# Altium footprint library 按键.PcbLib: 105 footprints (part 3 of 7)
Each footprint in its own frame and in the unit in brackets; x right, y up, seen from the top. Pads: shape width x height; smd on the part's side, far side on the other; paste and mask are expansions set on the pad; w line width, h text height; cw(c..) or ccw(c..) is an arc to the next point about the centre after c.
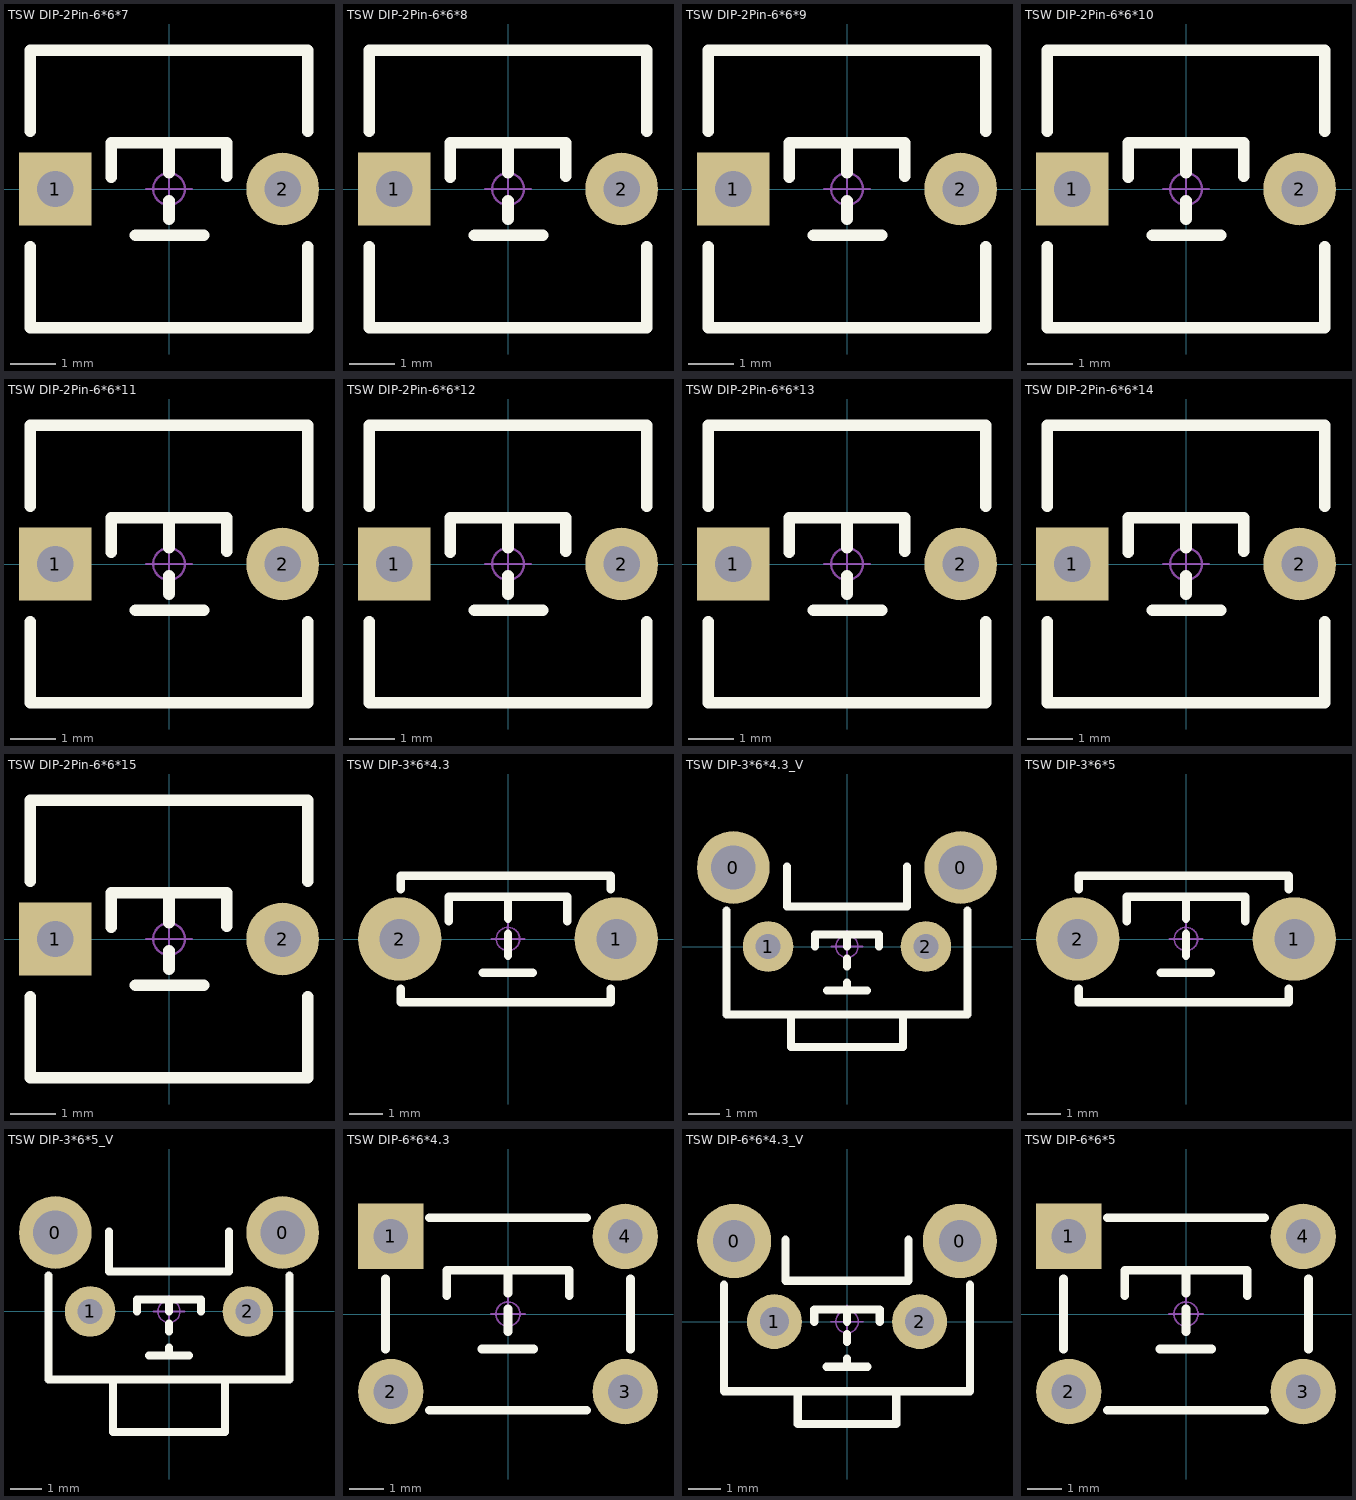
[diagram p2: the footprints below, top view; thin cyan lines are the x and y axes]

## TSW DIP-2Pin-6*6*7 [mm] "2Pin，6*6*7mm"
pads (2):
  rect 1.6x1.6 hole 0.8: 1(-2.5,0)
  round 1.6 hole 0.8: 2(2.5,0)
Top Overlay:
  lines w0.254: -3.048,-1.27 -3.048,-3.048 3.048,-3.048 3.048,-1.27 ; -3.048,1.27 -3.048,3.048 3.048,3.048 3.048,1.27 ; -1.27,0.254 -1.27,1.016 1.27,1.016 1.27,0.279 ; -0.737,-1.016 0.762,-1.016 ; 0,-0.66 0,-0.254 ; 0,0.356 0,1.016
Mechanical 15:
  circle w0.05: c0,0 r0.35
  lines w0.05: -0.5,0 0.5,0 ; 0,-0.5 0,0.5
3D body "TSW DIP-2Pin-6x6x7.STEP": height 7.05, standoff -3.45, extent -3,-3 3,3

## TSW DIP-2Pin-6*6*8 [mm] "2Pin，6*6*8mm"
pads (2):
  rect 1.6x1.6 hole 0.8: 1(-2.5,0)
  round 1.6 hole 0.8: 2(2.5,0)
Top Overlay:
  lines w0.254: -3.048,-1.27 -3.048,-3.048 3.048,-3.048 3.048,-1.27 ; -3.048,1.27 -3.048,3.048 3.048,3.048 3.048,1.27 ; -1.27,0.254 -1.27,1.016 1.27,1.016 1.27,0.279 ; -0.737,-1.016 0.762,-1.016 ; 0,-0.66 0,-0.254 ; 0,0.356 0,1.016
Mechanical 15:
  circle w0.05: c0,0 r0.35
  lines w0.05: -0.5,0 0.5,0 ; 0,-0.5 0,0.5
3D body "TSW DIP-2Pin-6x6x8.STEP": height 8.05, standoff -3.45, extent -3,-3 3,3

## TSW DIP-2Pin-6*6*9 [mm] "2Pin，6*6*9mm"
pads (2):
  rect 1.6x1.6 hole 0.8: 1(-2.5,0)
  round 1.6 hole 0.8: 2(2.5,0)
Top Overlay:
  lines w0.254: -3.048,-1.27 -3.048,-3.048 3.048,-3.048 3.048,-1.27 ; -3.048,1.27 -3.048,3.048 3.048,3.048 3.048,1.27 ; -1.27,0.254 -1.27,1.016 1.27,1.016 1.27,0.279 ; -0.737,-1.016 0.762,-1.016 ; 0,-0.66 0,-0.254 ; 0,0.356 0,1.016
Mechanical 15:
  circle w0.05: c0,0 r0.35
  lines w0.05: -0.5,0 0.5,0 ; 0,-0.5 0,0.5
3D body "TSW DIP-2Pin-6x6x9.STEP": height 9.05, standoff -3.45, extent -3,-3 3,3

## TSW DIP-2Pin-6*6*10 [mm] "2Pin，6*6*10mm"
pads (2):
  rect 1.6x1.6 hole 0.8: 1(-2.5,0)
  round 1.6 hole 0.8: 2(2.5,0)
Top Overlay:
  lines w0.254: -3.048,-1.27 -3.048,-3.048 3.048,-3.048 3.048,-1.27 ; -3.048,1.27 -3.048,3.048 3.048,3.048 3.048,1.27 ; -1.27,0.254 -1.27,1.016 1.27,1.016 1.27,0.279 ; -0.737,-1.016 0.762,-1.016 ; 0,-0.66 0,-0.254 ; 0,0.356 0,1.016
Mechanical 15:
  circle w0.05: c0,0 r0.35
  lines w0.05: -0.5,0 0.5,0 ; 0,-0.5 0,0.5
3D body "TSW DIP-2Pin-6x6x10.STEP": height 10.05, standoff -3.45, extent -3,-3 3,3

## TSW DIP-2Pin-6*6*11 [mm] "2Pin，6*6*11mm"
pads (2):
  rect 1.6x1.6 hole 0.8: 1(-2.5,0)
  round 1.6 hole 0.8: 2(2.5,0)
Top Overlay:
  lines w0.254: -3.048,-1.27 -3.048,-3.048 3.048,-3.048 3.048,-1.27 ; -3.048,1.27 -3.048,3.048 3.048,3.048 3.048,1.27 ; -1.27,0.254 -1.27,1.016 1.27,1.016 1.27,0.279 ; -0.737,-1.016 0.762,-1.016 ; 0,-0.66 0,-0.254 ; 0,0.356 0,1.016
Mechanical 15:
  circle w0.05: c0,0 r0.35
  lines w0.05: -0.5,0 0.5,0 ; 0,-0.5 0,0.5
3D body "TSW DIP-2Pin-6x6x11.STEP": height 11.05, standoff -3.45, extent -3,-3 3,3

## TSW DIP-2Pin-6*6*12 [mm] "2Pin，6*6*12mm"
pads (2):
  rect 1.6x1.6 hole 0.8: 1(-2.5,0)
  round 1.6 hole 0.8: 2(2.5,0)
Top Overlay:
  lines w0.254: -3.048,-1.27 -3.048,-3.048 3.048,-3.048 3.048,-1.27 ; -3.048,1.27 -3.048,3.048 3.048,3.048 3.048,1.27 ; -1.27,0.254 -1.27,1.016 1.27,1.016 1.27,0.279 ; -0.737,-1.016 0.762,-1.016 ; 0,-0.66 0,-0.254 ; 0,0.356 0,1.016
Mechanical 15:
  circle w0.05: c0,0 r0.35
  lines w0.05: -0.5,0 0.5,0 ; 0,-0.5 0,0.5
3D body "TSW DIP-2Pin-6x6x12.STEP": height 12.05, standoff -3.45, extent -3,-3 3,3

## TSW DIP-2Pin-6*6*13 [mm] "2Pin，6*6*13mm"
pads (2):
  rect 1.6x1.6 hole 0.8: 1(-2.5,0)
  round 1.6 hole 0.8: 2(2.5,0)
Top Overlay:
  lines w0.254: -3.048,-1.27 -3.048,-3.048 3.048,-3.048 3.048,-1.27 ; -3.048,1.27 -3.048,3.048 3.048,3.048 3.048,1.27 ; -1.27,0.254 -1.27,1.016 1.27,1.016 1.27,0.279 ; -0.737,-1.016 0.762,-1.016 ; 0,-0.66 0,-0.254 ; 0,0.356 0,1.016
Mechanical 15:
  circle w0.05: c0,0 r0.35
  lines w0.05: -0.5,0 0.5,0 ; 0,-0.5 0,0.5
3D body "TSW DIP-2Pin-6x6x13.STEP": height 13.05, standoff -3.45, extent -3,-3 3,3

## TSW DIP-2Pin-6*6*14 [mm] "2Pin，6*6*14mm"
pads (2):
  rect 1.6x1.6 hole 0.8: 1(-2.5,0)
  round 1.6 hole 0.8: 2(2.5,0)
Top Overlay:
  lines w0.254: -3.048,-1.27 -3.048,-3.048 3.048,-3.048 3.048,-1.27 ; -3.048,1.27 -3.048,3.048 3.048,3.048 3.048,1.27 ; -1.27,0.254 -1.27,1.016 1.27,1.016 1.27,0.279 ; -0.737,-1.016 0.762,-1.016 ; 0,-0.66 0,-0.254 ; 0,0.356 0,1.016
Mechanical 15:
  circle w0.05: c0,0 r0.35
  lines w0.05: -0.5,0 0.5,0 ; 0,-0.5 0,0.5
3D body "TSW DIP-2Pin-6x6x14.STEP": height 14.05, standoff -3.45, extent -3,-3 3,3

## TSW DIP-2Pin-6*6*15 [mm] "2Pin，6*6*15mm"
pads (2):
  rect 1.6x1.6 hole 0.8: 1(-2.5,0)
  round 1.6 hole 0.8: 2(2.5,0)
Top Overlay:
  lines w0.254: -3.048,-1.27 -3.048,-3.048 3.048,-3.048 3.048,-1.27 ; -3.048,1.27 -3.048,3.048 3.048,3.048 3.048,1.27 ; -1.27,0.254 -1.27,1.016 1.27,1.016 1.27,0.279 ; -0.737,-1.016 0.762,-1.016 ; 0,-0.66 0,-0.254 ; 0,0.356 0,1.016
Mechanical 15:
  circle w0.05: c0,0 r0.35
  lines w0.05: -0.5,0 0.5,0 ; 0,-0.5 0,0.5
3D body "TSW DIP-2Pin-6x6x15.STEP": height 15.05, standoff -3.45, extent -3,-3 3,3

## TSW DIP-3*6*4.3 [mm] "3*6*4.3mm"
pads (2):
  round 2.5 hole 1.2: 1(3.25,0) 2(-3.25,0)
Top Overlay:
  lines w0.254: -3.212,-1.499 -3.212,-1.9 3.088,-1.9 3.088,-1.499 ; -3.212,1.499 -3.212,1.9 3.088,1.9 3.088,1.499 ; -1.778,0.533 -1.778,1.27 1.778,1.27 1.778,0.533 ; -0.762,-1.016 0.737,-1.016 ; 0,-0.508 0,0.152 ; 0,0.61 0,1.27
Mechanical 15:
  circle w0.05: c0,0 r0.35
  lines w0.05: -0.5,0 0.5,0 ; 0,-0.5 0,0.5
3D body "TSW DIP-3x6x4.3.STEP": height 4.31, standoff -3.49, extent -3.914,-1.75 3.914,1.75

## TSW DIP-3*6*4.3_V [mm] "侧按轻触开关 3*6*4.3mm"
pads (4):
  round 2.3 hole 1.4: 0(-3.6,2.5) 0(3.6,2.5)
  round 1.6 hole 0.8: 1(-2.5,0) 2(2.5,0)
Top Overlay:
  lines w0.254: -3.81,1.143 -3.81,-2.159 3.81,-2.159 3.81,1.143 ; -1.905,2.54 -1.905,1.27 1.905,1.27 1.905,2.54 ; -1.778,-2.159 -1.778,-3.175 1.778,-3.175 1.778,-2.159 ; -1.016,0 -1.016,0.381 1.016,0.381 1.016,0 ; -0.635,-1.397 0.635,-1.397 ; 0,-1.397 0,-1.143 ; 0,-0.635 0,-0.381 ; 0,0 0,0.381
Mechanical 15:
  circle w0.05: c0,0 r0.35
  lines w0.05: -0.5,0 0.5,0 ; 0,-0.5 0,0.5
3D body "TSW DIP-3x6x4.3_V.STEP": height 4.45, standoff -2.8, extent -3.996,-3.05 3.996,3.5

## TSW DIP-3*6*5 [mm] "3*6*5mm"
pads (2):
  round 2.5 hole 1.2: 1(3.25,0) 2(-3.25,0)
Top Overlay:
  lines w0.254: -3.212,-1.499 -3.212,-1.9 3.088,-1.9 3.088,-1.499 ; -3.212,1.499 -3.212,1.9 3.088,1.9 3.088,1.499 ; -1.778,0.533 -1.778,1.27 1.778,1.27 1.778,0.533 ; -0.762,-1.016 0.737,-1.016 ; 0,-0.508 0,0.152 ; 0,0.61 0,1.27
Mechanical 15:
  circle w0.05: c0,0 r0.35
  lines w0.05: -0.5,0 0.5,0 ; 0,-0.5 0,0.5
3D body "TSW DIP-3x6x5.STEP": height 5.01, standoff -3.49, extent -3.914,-1.75 3.914,1.75

## TSW DIP-3*6*5_V [mm] "侧按轻触开关 3*6*5mm"
pads (4):
  round 2.3 hole 1.4: 0(-3.6,2.5) 0(3.6,2.5)
  round 1.6 hole 0.8: 1(-2.5,0) 2(2.5,0)
Top Overlay:
  lines w0.254: -3.81,1.143 -3.81,-2.159 3.81,-2.159 3.81,1.143 ; -1.905,2.54 -1.905,1.27 1.905,1.27 1.905,2.54 ; -1.778,-2.159 -1.778,-3.81 1.778,-3.81 1.778,-2.159 ; -1.016,0 -1.016,0.381 1.016,0.381 1.016,0 ; -0.635,-1.397 0.635,-1.397 ; 0,-1.397 0,-1.143 ; 0,-0.635 0,-0.381 ; 0,0 0,0.381
Mechanical 15:
  circle w0.05: c0,0 r0.35
  lines w0.05: -0.5,0 0.5,0 ; 0,-0.5 0,0.5
3D body "TSW DIP-3x6x5_V.STEP": height 4.45, standoff -2.8, extent -3.996,-3.75 3.996,3.5

## TSW DIP-6*6*4.3 [mm] "6*6*4.3mm"
pads (4):
  rect 1.9x1.9 hole 1: 1(-3.4,2.25)
  round 1.9 hole 1: 2(-3.4,-2.25) 3(3.4,-2.25) 4(3.4,2.25)
Top Overlay:
  lines w0.254: -3.556,-1.016 -3.556,1.016 ; -2.286,-2.794 2.286,-2.794 ; -2.286,2.794 2.286,2.794 ; -1.778,0.533 -1.778,1.27 1.778,1.27 1.778,0.533 ; -0.762,-1.016 0.737,-1.016 ; 0,-0.508 0,0.152 ; 0,0.61 0,1.27 ; 3.556,-1.016 3.556,1.016
Bottom Overlay:
  lines w0.254: -2.286,-2.286 2.286,-2.286 ; -2.286,2.286 2.286,2.286
Mechanical 15:
  circle w0.05: c0,0 r0.35
  lines w0.05: -0.5,0 0.5,0 ; 0,-0.5 0,0.5
3D body "TSW DIP-6x6x4.3.STEP": height 4.25, standoff -3.45, extent -4.106,-3 4.106,3

## TSW DIP-6*6*4.3_V [mm] "侧按轻触开关 6*6*4.3mm"
pads (4):
  round 2.3 hole 1.3: 0(-3.5,2.5) 0(3.5,2.5)
  round 1.7 hole 0.9: 1(-2.25,0) 2(2.25,0)
Top Overlay:
  lines w0.254: -3.81,1.143 -3.81,-2.159 3.81,-2.159 3.81,1.143 ; -1.905,2.54 -1.905,1.27 1.905,1.27 1.905,2.54 ; -1.524,-2.159 -1.524,-3.175 1.524,-3.175 1.524,-2.159 ; -1.016,0 -1.016,0.381 1.016,0.381 1.016,0 ; -0.635,-1.397 0.635,-1.397 ; 0,-1.397 0,-1.143 ; 0,-0.635 0,-0.381 ; 0,0 0,0.381
Mechanical 15:
  circle w0.05: c0,0 r0.35
  lines w0.05: -0.5,0 0.5,0 ; 0,-0.5 0,0.5
3D body "TSW DIP-6x6x4.3_V.STEP": height 7.47, standoff -3.4, extent -4.183,-3.023 4.184,4.127

## TSW DIP-6*6*5 [mm] "6*6*5mm"
pads (4):
  rect 1.9x1.9 hole 1: 1(-3.4,2.25)
  round 1.9 hole 1: 2(-3.4,-2.25) 3(3.4,-2.25) 4(3.4,2.25)
Top Overlay:
  lines w0.254: -3.556,-1.016 -3.556,1.016 ; -2.286,-2.794 2.286,-2.794 ; -2.286,2.794 2.286,2.794 ; -1.778,0.533 -1.778,1.27 1.778,1.27 1.778,0.533 ; -0.762,-1.016 0.737,-1.016 ; 0,-0.508 0,0.152 ; 0,0.61 0,1.27 ; 3.556,-1.016 3.556,1.016
Bottom Overlay:
  lines w0.254: -2.286,-2.286 2.286,-2.286 ; -2.286,2.286 2.286,2.286
Mechanical 15:
  circle w0.05: c0,0 r0.35
  lines w0.05: -0.5,0 0.5,0 ; 0,-0.5 0,0.5
3D body "TSW DIP-6x6x5.STEP": height 4.95, standoff -3.45, extent -4.106,-3 4.106,3